# Altium footprint library MODULE.PcbLib: 26 footprints (part 2 of 2)
Each footprint in its own frame and in the unit in brackets; x right, y up, seen from the top. Pads: shape width x height; smd on the part's side, far side on the other; paste and mask are expansions set on the pad; w line width, h text height; cw(c..) or ccw(c..) is an arc to the next point about the centre after c.
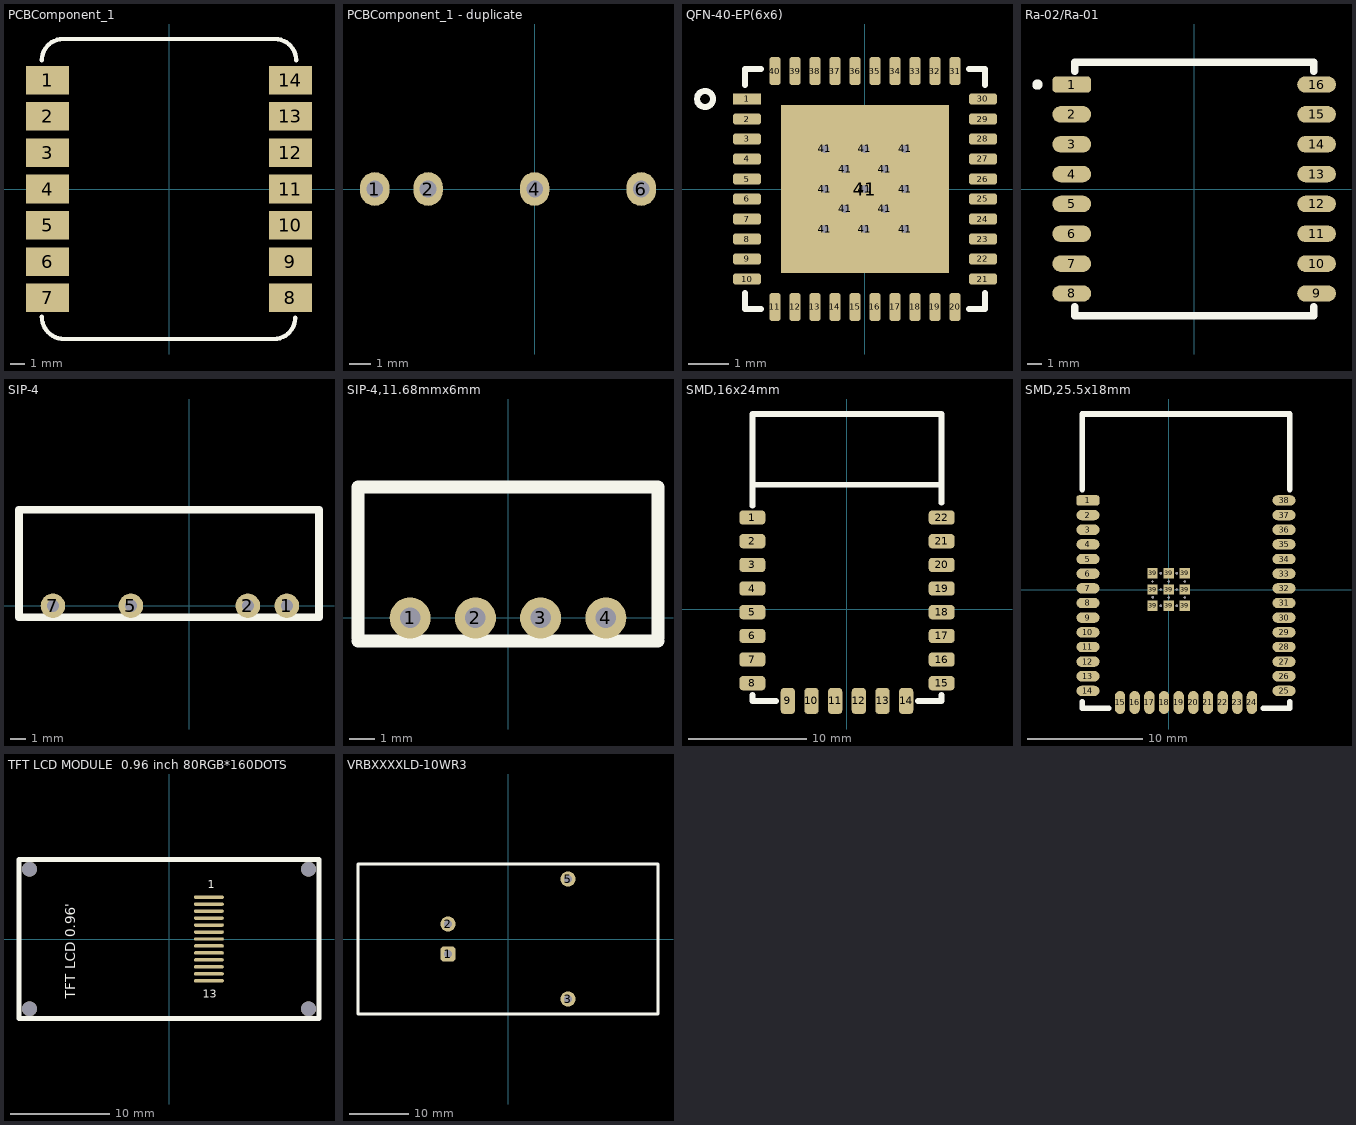
[diagram p1: the footprints below, top view; thin cyan lines are the x and y axes]

## PCBComponent_1 [mm]
pads (14):
  rect 3x2 smd: 1(-8.5,7.62) 2(-8.5,5.08) 3(-8.5,2.54) 4(-8.5,0) 5(-8.5,-2.54) 6(-8.5,-5.08) 7(-8.5,-7.62) 8(8.5,-7.62) 9(8.5,-5.08) 10(8.5,-2.54) 11(8.5,0) 12(8.5,2.54) 13(8.5,5.08) 14(8.5,7.62)
Top Overlay:
  lines w0.3: -8.9,-8.95 ccw(c-7.35,-8.95) -7.35,-10.5 7.42,-10.5 ; -8.9,9.02 cw(c-7.42,9.02) -7.42,10.5 7.42,10.5 cw(c7.42,9.02) 8.9,9.02 ; 7.35,-10.5 ccw(c7.35,-9.02) 8.83,-9.02

## PCBComponent_1 - duplicate [mm]
pads (4):
  oval 1.4x1.6 hole 0.8: 1(-7.62,0) 2(-5.08,0) 4(0,0) 6(5.08,0)

## QFN-40-EP(6x6) [mm]
pads (54):
  rect 0.7x0.28 smd mask+0.15: 1(-2.95,2.25)
  rrect50% 0.7x0.28 smd mask+0.15: 2(-2.95,1.75) 3(-2.95,1.25) 4(-2.95,0.75) 5(-2.95,0.25) 6(-2.95,-0.25) 7(-2.95,-0.75) 8(-2.95,-1.25) 9(-2.95,-1.75) 10(-2.95,-2.25) 21(2.95,-2.25) 22(2.95,-1.75) 23(2.95,-1.25) 24(2.95,-0.75) 25(2.95,-0.25) 26(2.95,0.25) 27(2.95,0.75) 28(2.95,1.25) 29(2.95,1.75) 30(2.95,2.25)
  rrect50% 0.28x0.7 smd mask+0.15: 11(-2.25,-2.95) 12(-1.75,-2.95) 13(-1.25,-2.95) 14(-0.75,-2.95) 15(-0.25,-2.95) 16(0.25,-2.95) 17(0.75,-2.95) 18(1.25,-2.95) 19(1.75,-2.95) 20(2.25,-2.95) 31(2.25,2.95) 32(1.75,2.95) 33(1.25,2.95) 34(0.75,2.95) 35(0.25,2.95) 36(-0.25,2.95) 37(-0.75,2.95) 38(-1.25,2.95) 39(-1.75,2.95) 40(-2.25,2.95)
  round 0.4 hole 0.2: 41(-1,-1) 41(-1,0) 41(-1,1) 41(-0.5,-0.5) 41(-0.5,0.5) 41(0,-1) 41(0,0) 41(0,1) 41(0.5,-0.5) 41(0.5,0.5) 41(1,-1) 41(1,0) 41(1,1)
  rect 4.2x4.2 smd mask+0.15: 41(0,0)
Top Overlay:
  circle w0.15: c-4,2.25 r0.2
  lines w0.15: -3,-2.6 -3,-3 -2.6,-3 ; -3,2.6 -3,3 -2.6,3 ; 2.6,-3 3,-3 3,-2.6 ; 2.6,3 3,3 3,2.6
3D body "QFN-40 (6x6x0.9).step": height 0.92, standoff 0, extent -3,-3 3,3

## Ra-02/Ra-01 [mm]
pads (16):
  rrect50% 2.6x1.1 smd: 1(-8.2,7)
  oval 2.6x1.1 smd: 2(-8.2,5) 3(-8.2,3) 4(-8.2,1) 5(-8.2,-1) 6(-8.2,-3) 7(-8.2,-5) 8(-8.2,-7) 9(8.2,-7) 10(8.2,-5) 11(8.2,-3) 12(8.2,-1) 13(8.2,1) 14(8.2,3) 15(8.2,5) 16(8.2,7)
Top Overlay:
  circle w0.5: c-10.5,7 r0.1
  lines w0.5: -8,-7.9 -8,-8.5 8,-8.5 8,-7.9 ; -8,7.9 -8,8.5 8,8.5 8,7.9
3D body "User Library-RA-02-2.STEP": height 3.2, standoff 0, extent -8,-8.5 8,8.5

## SIP-4 [mm]
pads (4):
  round 1.6 hole 0.8 mask+0.2: 1(6.35,0) 2(3.81,0) 5(-3.81,0) 7(-8.89,0)
Top Overlay:
  lines w0.5: -11.1,-0.75 8.44,-0.75 8.44,6.25 -11.1,6.25 -11.1,-0.75
3D body "B0505S-2W.stp": height 10.2, standoff -4, extent -11.07,-0.7 8.53,6.3

## SIP-4,11.68mmx6mm [mm]
pads (4):
  round 1.6 hole 0.8 mask+0.2: 1(-3.81,0) 2(-1.27,0) 3(1.27,0) 4(3.81,0)
Top Overlay:
  lines w0.5: -5.84,-0.9 5.84,-0.9 ; -5.84,-0.75 -5.84,5.1 5.84,5.1 5.84,-0.75
3D body "DC-DC_B5050S-1W.stp": height 10.16, standoff -4.1, extent -5.8,-0.9 5.8,5.1

## SMD,16x24mm [mm]
pads (22):
  rrect50% 2.2x1.2 smd: 1(-8,7.75) 2(-8,5.75) 3(-8,3.75) 4(-8,1.75) 5(-8,-0.25) 6(-8,-2.25) 7(-8,-4.25) 8(-8,-6.25) 15(8,-6.25) 16(8,-4.25) 17(8,-2.25) 18(8,-0.25) 19(8,1.75) 20(8,3.75) 21(8,5.75) 22(8,7.75)
  rrect50% 1.2x2.2 smd: 9(-5,-7.75) 10(-3,-7.75) 11(-1,-7.75) 12(1,-7.75) 13(3,-7.75) 14(5,-7.75)
Top Overlay:
  lines w0.5: -8,-7.25 -8,-7.75 -6,-7.75 ; -8,8.75 -8,16.5 8,16.5 8,9 ; -8,10.521 7.824,10.521 ; 6,-7.75 8,-7.75 8,-7.25
3D body "ESP-12F.STEP": height 3.17, standoff 0, extent -8,-7.8 8,16.2

## SMD,25.5x18mm [mm]
pads (47):
  rrect50% 2x0.9 smd mask+0.1: 1(-7,7.72)
  oval 2x0.9 smd mask+0.1: 2(-7,6.45) 3(-7,5.18) 4(-7,3.91) 5(-7,2.64) 6(-7,1.37) 7(-7,0.1) 8(-7,-1.17) 9(-7,-2.44) 10(-7,-3.71) 11(-7,-4.98) 12(-7,-6.25) 13(-7,-7.52) 14(-7,-8.79) 25(10,-8.79) 26(10,-7.52) 27(10,-6.25) 28(10,-4.98) 29(10,-3.71) 30(10,-2.44) 31(10,-1.17) 32(10,0.1) 33(10,1.37) 34(10,2.64) 35(10,3.91) 36(10,5.18) 37(10,6.45) 38(10,7.72)
  oval 0.9x2 smd mask+0.1: 15(-4.215,-9.79) 16(-2.945,-9.79) 17(-1.675,-9.79) 18(-0.405,-9.79) 19(0.865,-9.79) 20(2.135,-9.79) 21(3.405,-9.79) 22(4.675,-9.79) 23(5.945,-9.79) 24(7.215,-9.79)
  rect 0.9x0.9 smd mask+0.1: 39(-1.4,-1.4) 39(-1.4,0) 39(-1.4,1.4) 39(0,-1.4) 39(0,0) 39(0,1.4) 39(1.4,-1.4) 39(1.4,0) 39(1.4,1.4)
via -1.4,0.7 diameter 0.2 hole 0.2
via -0.7,-1.4 diameter 0.2 hole 0.2
via 0,0.7 diameter 0.2 hole 0.2
via 0.7,0 diameter 0.2 hole 0.2
via -0.7,0 diameter 0.2 hole 0.2
via 1.4,0.7 diameter 0.2 hole 0.2
via 1.4,-0.7 diameter 0.2 hole 0.2
via 0,-0.7 diameter 0.2 hole 0.2
via -1.374,-0.681 diameter 0.2 hole 0.2
via 0.7,-1.4 diameter 0.2 hole 0.2
via 0.7,1.4 diameter 0.2 hole 0.2
via -0.7,1.4 diameter 0.2 hole 0.2
Top Overlay:
  lines w0.5: -7.5,-9.735 -7.5,-10.29 -5.2,-10.29 ; -7.5,8.665 -7.5,15.21 10.5,15.21 10.5,8.665 ; 8.2,-10.29 10.5,-10.29 10.5,-9.735
3D body "ESP32-WROOM-32 v1.step": height 3.9, standoff 0, extent -7.5,-10.29 10.5,15.21

## TFT LCD MODULE  0.96 inch 80RGB*160DOTS [mm]
pads (17):
  oval 3x0.35 smd: 1(4,4.2) 2(4,3.5) 3(4,2.8) 4(4,2.1) 5(4,1.4) 6(4,0.7) 7(4,0) 8(4,-0.7) 9(4,-1.4) 10(4,-2.1) 11(4,-2.8) 12(4,-3.5) 13(4,-4.2)
  round 1.5 hole 1.5: ""(-14,-7) ""(-14,7) ""(14,-7) ""(14,7)
Top Overlay:
  lines w0.5: -15.05,-8 -15.05,8 15.05,8 15.05,-8 -15.05,-8
  text "13" at 3.4,-5.9 h0.8
  text "1" at 3.867,5.1 h0.8
  text "TFT LCD 0.96'" at -9.417,-5.998 h1
3D body "0.96? IPS ?????.STEP": height 2, standoff 0.15, extent -14.811,-6.71 14.789,6.79

## VRBXXXXLD-10WR3 [mm]
pads (4):
  rrect50% 2.6x2.6 hole 1.3 mask+0.25: 1(-10.16,-2.54)
  round 2.6 hole 1.3 mask+0.25: 2(-10.16,2.54) 3(10.16,-10.16) 5(10.16,10.16)
Top Overlay:
  lines w0.5: -25.4,-12.7 -25.4,12.7 25.4,12.7 25.4,-12.7 -25.4,-12.7